# Altium footprint library Connector_PinHeader_2.00mm.PcbLib: 278 footprints (part 11 of 18)
Each footprint in its own frame and in the unit in brackets; x right, y up, seen from the top. Pads: shape width x height; smd on the part's side, far side on the other; paste and mask are expansions set on the pad; w line width, h text height; cw(c..) or ccw(c..) is an arc to the next point about the centre after c.
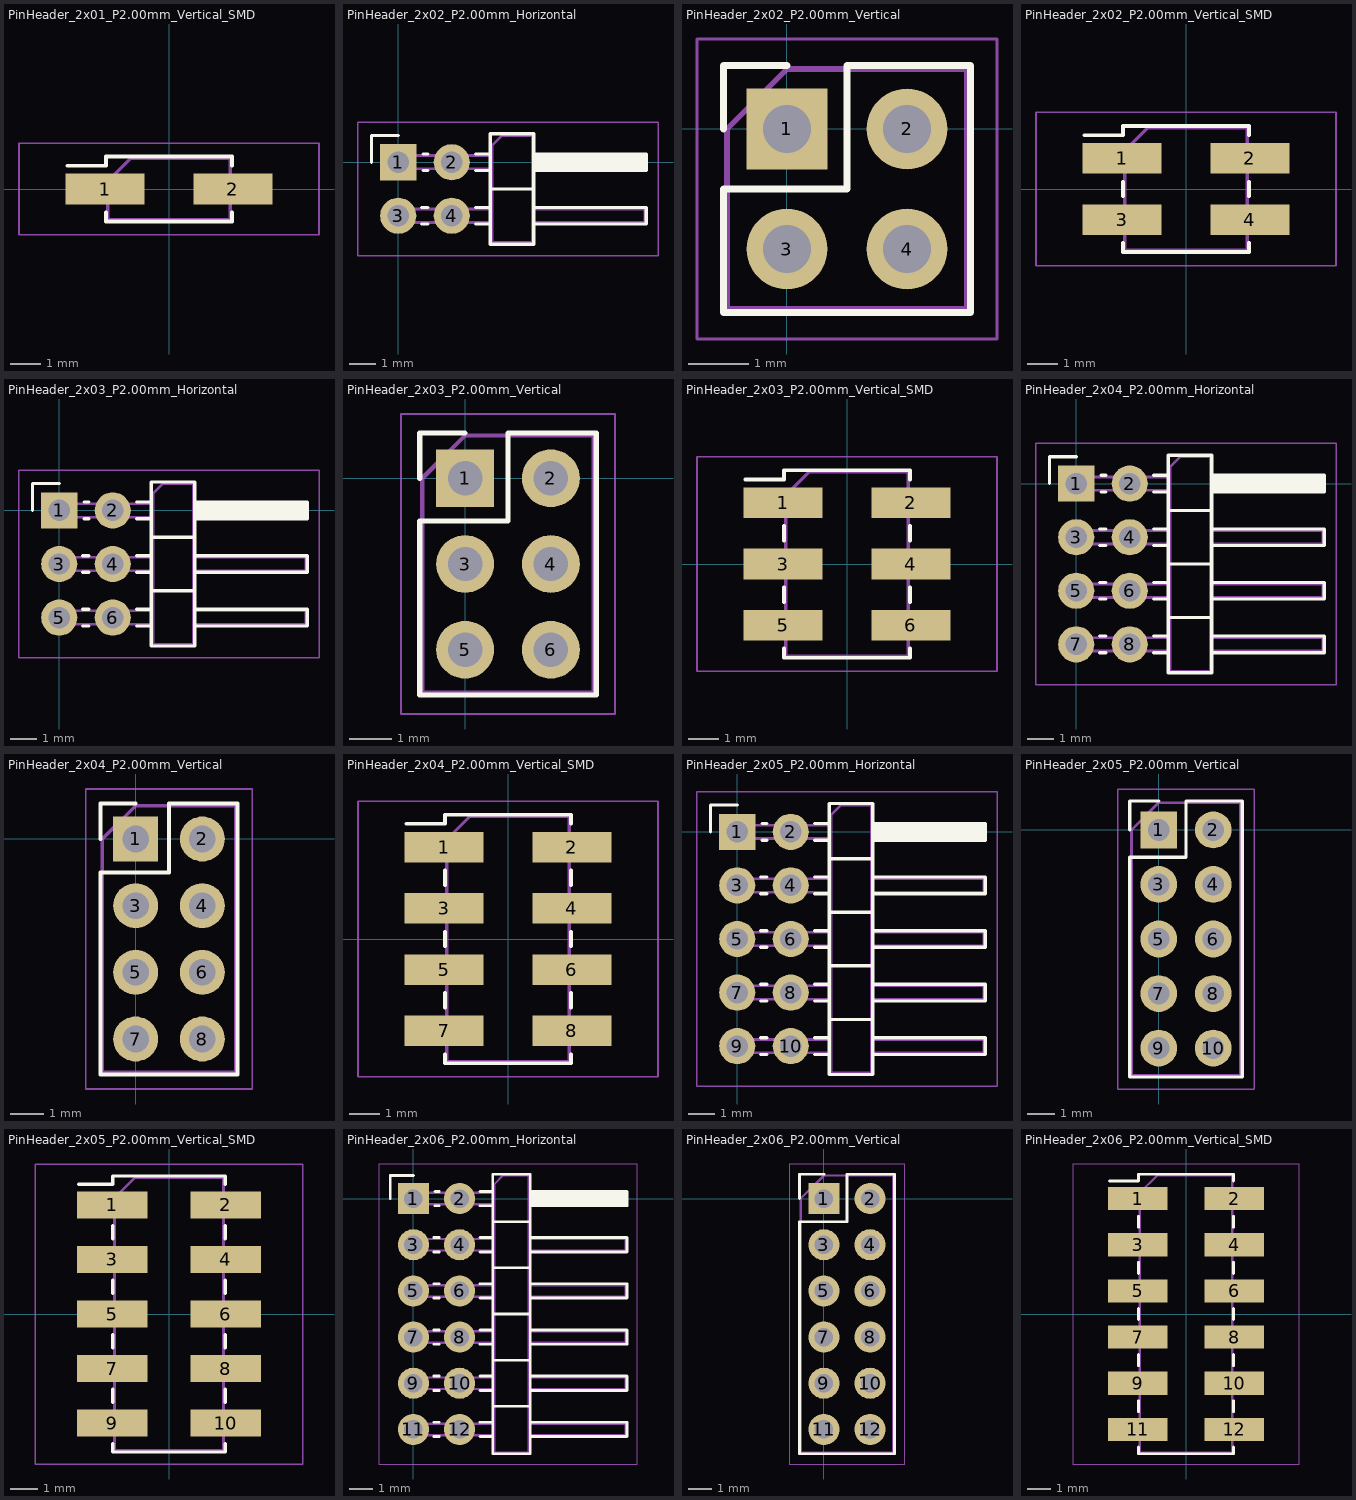
[diagram p10: the footprints below, top view; thin cyan lines are the x and y axes]

## PinHeader_2x01_P2.00mm_Vertical_SMD [mm]
pads (2):
  rect 2.58x1 smd: 1(-2.085,0) 2(2.085,0)
F.SilkS:
  lines w0.12: -3.315,0.76 -2.06,0.76 -2.06,1.06 2.06,1.06 2.06,0.76 ; -2.06,-0.76 -2.06,-1.06 2.06,-1.06 2.06,-0.76
F.CrtYd:
  lines w0.05: -4.9,-1.5 -4.9,1.5 4.9,1.5 4.9,-1.5 -4.9,-1.5
F.Fab:
  lines w0.1: -2,-0.25 -2.875,-0.25 -2.875,0.25 -2,0.25 ; 2,-0.25 2.875,-0.25 2.875,0.25 2,0.25 ; -2,0.25 -2,-1 2,-1 2,1 -1.25,1 -2,0.25
  text "'.Designator'" at 0.84,-4.047 h1

## PinHeader_2x02_P2.00mm_Horizontal [mm]
pads (4):
  rect 1.35x1.35 hole 0.8: 1(0,0)
  rrect100% 1.35x1.35 hole 0.8: 2(2,0) 3(0,-2) 4(2,-2)
F.SilkS:
  lines w0.12: -1,0 -1,1 0,1 ; 0.882,-2.31 1.118,-2.31 ; 0.882,-1.69 1.118,-1.69 ; 0.935,-0.31 1.118,-0.31 ; 0.935,0.31 1.118,0.31 ; 2.882,-2.31 3.44,-2.31 ; 2.882,-1.69 3.44,-1.69 ; 2.882,-0.31 3.44,-0.31 ; 2.882,0.31 3.44,0.31 ; 3.44,-1 5.06,-1 ; 5.06,-2.31 9.26,-2.31 9.26,-1.69 5.06,-1.69 ; 5.06,-0.31 9.26,-0.31 9.26,0.31 5.06,0.31 ; 5.06,-0.23 9.26,-0.23 ; 5.06,-0.11 9.26,-0.11 ; 5.06,0.01 9.26,0.01 ; 5.06,0.13 9.26,0.13 ; 5.06,0.25 9.26,0.25 ; 3.44,-3.06 3.44,1.06 5.06,1.06 5.06,-3.06 3.44,-3.06
F.CrtYd:
  lines w0.05: -1.5,-3.5 -1.5,1.5 9.7,1.5 9.7,-3.5 -1.5,-3.5
F.Fab:
  lines w0.1: 3.5,-2.25 -0.25,-2.25 -0.25,-1.75 3.5,-1.75 ; 3.5,-0.25 -0.25,-0.25 -0.25,0.25 3.5,0.25 ; 5,-2.25 9.2,-2.25 9.2,-1.75 5,-1.75 ; 5,-0.25 9.2,-0.25 9.2,0.25 5,0.25 ; 3.5,-3 3.5,0.625 3.875,1 5,1 5,-3 3.5,-3
  text "'.Designator'" at 5.006,-4.642 h0.9

## PinHeader_2x02_P2.00mm_Vertical [mm]
pads (4):
  rect 1.35x1.35 hole 0.8: 1(0,0)
  rrect100% 1.35x1.35 hole 0.8: 2(2,0) 3(0,-2) 4(2,-2)
F.SilkS:
  lines w0.12: -1.06,0 -1.06,1.06 0,1.06 ; -1.06,-3.06 3.06,-3.06 3.06,1.06 1,1.06 1,-1 -1.06,-1 -1.06,-3.06
F.CrtYd:
  lines w0.05: -1.5,-3.5 3.5,-3.5 3.5,1.5 -1.5,1.5 -1.5,-3.5
F.Fab:
  lines w0.1: -1,-3 3,-3 3,1 0,1 -1,0 -1,-3
  text "'.Designator'" at 1.84,-5.047 h1

## PinHeader_2x02_P2.00mm_Vertical_SMD [mm]
pads (4):
  rect 2.58x1 smd: 1(-2.085,1) 2(2.085,1) 3(-2.085,-1) 4(2.085,-1)
F.SilkS:
  lines w0.12: -3.315,1.76 -2.06,1.76 -2.06,2.06 2.06,2.06 2.06,1.76 ; -2.06,-1.76 -2.06,-2.06 2.06,-2.06 2.06,-1.76 ; -2.06,-0.24 -2.06,0.24 ; 2.06,-0.24 2.06,0.24
F.CrtYd:
  lines w0.05: -4.9,-2.5 -4.9,2.5 4.9,2.5 4.9,-2.5 -4.9,-2.5
F.Fab:
  lines w0.1: -2,-1.25 -2.875,-1.25 -2.875,-0.75 -2,-0.75 ; -2,0.75 -2.875,0.75 -2.875,1.25 -2,1.25 ; 2,-1.25 2.875,-1.25 2.875,-0.75 2,-0.75 ; 2,0.75 2.875,0.75 2.875,1.25 2,1.25 ; -2,1.25 -2,-2 2,-2 2,2 -1.25,2 -2,1.25
  text "'.Designator'" at 0.84,-4.047 h1

## PinHeader_2x03_P2.00mm_Horizontal [mm]
pads (6):
  rect 1.35x1.35 hole 0.8: 1(0,0)
  rrect100% 1.35x1.35 hole 0.8: 2(2,0) 3(0,-2) 4(2,-2) 5(0,-4) 6(2,-4)
F.SilkS:
  lines w0.12: -1,0 -1,1 0,1 ; 0.882,-4.31 1.118,-4.31 ; 0.882,-3.69 1.118,-3.69 ; 0.882,-2.31 1.118,-2.31 ; 0.882,-1.69 1.118,-1.69 ; 0.935,-0.31 1.118,-0.31 ; 0.935,0.31 1.118,0.31 ; 2.882,-4.31 3.44,-4.31 ; 2.882,-3.69 3.44,-3.69 ; 2.882,-2.31 3.44,-2.31 ; 2.882,-1.69 3.44,-1.69 ; 2.882,-0.31 3.44,-0.31 ; 2.882,0.31 3.44,0.31 ; 3.44,-3 5.06,-3 ; 3.44,-1 5.06,-1 ; 5.06,-4.31 9.26,-4.31 9.26,-3.69 5.06,-3.69 ; 5.06,-2.31 9.26,-2.31 9.26,-1.69 5.06,-1.69 ; 5.06,-0.31 9.26,-0.31 9.26,0.31 5.06,0.31 ; 5.06,-0.23 9.26,-0.23 ; 5.06,-0.11 9.26,-0.11 ; 5.06,0.01 9.26,0.01 ; 5.06,0.13 9.26,0.13 ; 5.06,0.25 9.26,0.25 ; 3.44,-5.06 5.06,-5.06 5.06,1.06 3.44,1.06 3.44,-5.06
F.CrtYd:
  lines w0.05: -1.5,-5.5 9.7,-5.5 9.7,1.5 -1.5,1.5 -1.5,-5.5
F.Fab:
  lines w0.1: 3.5,-4.25 -0.25,-4.25 -0.25,-3.75 3.5,-3.75 ; 3.5,-2.25 -0.25,-2.25 -0.25,-1.75 3.5,-1.75 ; 3.5,-0.25 -0.25,-0.25 -0.25,0.25 3.5,0.25 ; 5,-4.25 9.2,-4.25 9.2,-3.75 5,-3.75 ; 5,-2.25 9.2,-2.25 9.2,-1.75 5,-1.75 ; 5,-0.25 9.2,-0.25 9.2,0.25 5,0.25 ; 3.5,-5 3.5,0.625 3.875,1 5,1 5,-5 3.5,-5
  text "'.Designator'" at 5.006,-5.642 h0.9

## PinHeader_2x03_P2.00mm_Vertical [mm]
pads (6):
  rect 1.35x1.35 hole 0.8: 1(0,0)
  rrect100% 1.35x1.35 hole 0.8: 2(2,0) 3(0,-2) 4(2,-2) 5(0,-4) 6(2,-4)
F.SilkS:
  lines w0.12: -1.06,0 -1.06,1.06 0,1.06 ; -1.06,-5.06 -1.06,-1 1,-1 1,1.06 3.06,1.06 3.06,-5.06 -1.06,-5.06
F.CrtYd:
  lines w0.05: -1.5,-5.5 3.5,-5.5 3.5,1.5 -1.5,1.5 -1.5,-5.5
F.Fab:
  lines w0.1: -1,-5 3,-5 3,1 0,1 -1,0 -1,-5
  text "'.Designator'" at 1.84,-6.047 h1

## PinHeader_2x03_P2.00mm_Vertical_SMD [mm]
pads (6):
  rect 2.58x1 smd: 1(-2.085,2) 2(2.085,2) 3(-2.085,0) 4(2.085,0) 5(-2.085,-2) 6(2.085,-2)
F.SilkS:
  lines w0.12: -3.315,2.76 -2.06,2.76 -2.06,3.06 2.06,3.06 2.06,2.76 ; -2.06,-2.76 -2.06,-3.06 2.06,-3.06 2.06,-2.76 ; -2.06,-1.24 -2.06,-0.76 ; -2.06,0.76 -2.06,1.24 ; 2.06,-1.24 2.06,-0.76 ; 2.06,0.76 2.06,1.24
F.CrtYd:
  lines w0.05: -4.9,-3.5 4.9,-3.5 4.9,3.5 -4.9,3.5 -4.9,-3.5
F.Fab:
  lines w0.1: -2,-2.25 -2.875,-2.25 -2.875,-1.75 -2,-1.75 ; -2,-0.25 -2.875,-0.25 -2.875,0.25 -2,0.25 ; -2,1.75 -2.875,1.75 -2.875,2.25 -2,2.25 ; 2,-2.25 2.875,-2.25 2.875,-1.75 2,-1.75 ; 2,-0.25 2.875,-0.25 2.875,0.25 2,0.25 ; 2,1.75 2.875,1.75 2.875,2.25 2,2.25 ; -2,2.25 -1.25,3 2,3 2,-3 -2,-3 -2,2.25
  text "'.Designator'" at 0.84,-4.047 h1

## PinHeader_2x04_P2.00mm_Horizontal [mm]
pads (8):
  rect 1.35x1.35 hole 0.8: 1(0,0)
  rrect100% 1.35x1.35 hole 0.8: 2(2,0) 3(0,-2) 4(2,-2) 5(0,-4) 6(2,-4) 7(0,-6) 8(2,-6)
F.SilkS:
  lines w0.12: -1,0 -1,1 0,1 ; 0.882,-6.31 1.118,-6.31 ; 0.882,-5.69 1.118,-5.69 ; 0.882,-4.31 1.118,-4.31 ; 0.882,-3.69 1.118,-3.69 ; 0.882,-2.31 1.118,-2.31 ; 0.882,-1.69 1.118,-1.69 ; 0.935,-0.31 1.118,-0.31 ; 0.935,0.31 1.118,0.31 ; 2.882,-6.31 3.44,-6.31 ; 2.882,-5.69 3.44,-5.69 ; 2.882,-4.31 3.44,-4.31 ; 2.882,-3.69 3.44,-3.69 ; 2.882,-2.31 3.44,-2.31 ; 2.882,-1.69 3.44,-1.69 ; 2.882,-0.31 3.44,-0.31 ; 2.882,0.31 3.44,0.31 ; 3.44,-5 5.06,-5 ; 3.44,-3 5.06,-3 ; 3.44,-1 5.06,-1 ; 5.06,-6.31 9.26,-6.31 9.26,-5.69 5.06,-5.69 ; 5.06,-4.31 9.26,-4.31 9.26,-3.69 5.06,-3.69 ; 5.06,-2.31 9.26,-2.31 9.26,-1.69 5.06,-1.69 ; 5.06,-0.31 9.26,-0.31 9.26,0.31 5.06,0.31 ; 5.06,-0.23 9.26,-0.23 ; 5.06,-0.11 9.26,-0.11 ; 5.06,0.01 9.26,0.01 ; 5.06,0.13 9.26,0.13 ; 5.06,0.25 9.26,0.25 ; 3.44,-7.06 5.06,-7.06 5.06,1.06 3.44,1.06 3.44,-7.06
F.CrtYd:
  lines w0.05: -1.5,-7.5 -1.5,1.5 9.7,1.5 9.7,-7.5 -1.5,-7.5
F.Fab:
  lines w0.1: 3.5,-6.25 -0.25,-6.25 -0.25,-5.75 3.5,-5.75 ; 3.5,-4.25 -0.25,-4.25 -0.25,-3.75 3.5,-3.75 ; 3.5,-2.25 -0.25,-2.25 -0.25,-1.75 3.5,-1.75 ; 3.5,-0.25 -0.25,-0.25 -0.25,0.25 3.5,0.25 ; 5,-6.25 9.2,-6.25 9.2,-5.75 5,-5.75 ; 5,-4.25 9.2,-4.25 9.2,-3.75 5,-3.75 ; 5,-2.25 9.2,-2.25 9.2,-1.75 5,-1.75 ; 5,-0.25 9.2,-0.25 9.2,0.25 5,0.25 ; 3.5,-7 3.5,0.625 3.875,1 5,1 5,-7 3.5,-7
  text "'.Designator'" at 5.006,-6.642 h0.9

## PinHeader_2x04_P2.00mm_Vertical [mm]
pads (8):
  rect 1.35x1.35 hole 0.8: 1(0,0)
  rrect100% 1.35x1.35 hole 0.8: 2(2,0) 3(0,-2) 4(2,-2) 5(0,-4) 6(2,-4) 7(0,-6) 8(2,-6)
F.SilkS:
  lines w0.12: -1.06,0 -1.06,1.06 0,1.06 ; -1.06,-7.06 -1.06,-1 1,-1 1,1.06 3.06,1.06 3.06,-7.06 -1.06,-7.06
F.CrtYd:
  lines w0.05: -1.5,-7.5 3.5,-7.5 3.5,1.5 -1.5,1.5 -1.5,-7.5
F.Fab:
  lines w0.1: -1,-7 3,-7 3,1 0,1 -1,0 -1,-7
  text "'.Designator'" at 1.84,-7.047 h1

## PinHeader_2x04_P2.00mm_Vertical_SMD [mm]
pads (8):
  rect 2.58x1 smd: 1(-2.085,3) 2(2.085,3) 3(-2.085,1) 4(2.085,1) 5(-2.085,-1) 6(2.085,-1) 7(-2.085,-3) 8(2.085,-3)
F.SilkS:
  lines w0.12: -3.315,3.76 -2.06,3.76 -2.06,4.06 2.06,4.06 2.06,3.76 ; -2.06,-3.76 -2.06,-4.06 2.06,-4.06 2.06,-3.76 ; -2.06,-2.24 -2.06,-1.76 ; -2.06,-0.24 -2.06,0.24 ; -2.06,1.76 -2.06,2.24 ; 2.06,-2.24 2.06,-1.76 ; 2.06,-0.24 2.06,0.24 ; 2.06,1.76 2.06,2.24
F.CrtYd:
  lines w0.05: -4.9,-4.5 4.9,-4.5 4.9,4.5 -4.9,4.5 -4.9,-4.5
F.Fab:
  lines w0.1: -2,-3.25 -2.875,-3.25 -2.875,-2.75 -2,-2.75 ; -2,-1.25 -2.875,-1.25 -2.875,-0.75 -2,-0.75 ; -2,0.75 -2.875,0.75 -2.875,1.25 -2,1.25 ; -2,2.75 -2.875,2.75 -2.875,3.25 -2,3.25 ; 2,-3.25 2.875,-3.25 2.875,-2.75 2,-2.75 ; 2,-1.25 2.875,-1.25 2.875,-0.75 2,-0.75 ; 2,0.75 2.875,0.75 2.875,1.25 2,1.25 ; 2,2.75 2.875,2.75 2.875,3.25 2,3.25 ; -2,3.25 -2,-4 2,-4 2,4 -1.25,4 -2,3.25
  text "'.Designator'" at 0.84,-4.047 h1

## PinHeader_2x05_P2.00mm_Horizontal [mm]
pads (10):
  rect 1.35x1.35 hole 0.8: 1(0,0)
  rrect100% 1.35x1.35 hole 0.8: 2(2,0) 3(0,-2) 4(2,-2) 5(0,-4) 6(2,-4) 7(0,-6) 8(2,-6) 9(0,-8) 10(2,-8)
F.SilkS:
  lines w0.12: -1,0 -1,1 0,1 ; 0.882,-8.31 1.118,-8.31 ; 0.882,-7.69 1.118,-7.69 ; 0.882,-6.31 1.118,-6.31 ; 0.882,-5.69 1.118,-5.69 ; 0.882,-4.31 1.118,-4.31 ; 0.882,-3.69 1.118,-3.69 ; 0.882,-2.31 1.118,-2.31 ; 0.882,-1.69 1.118,-1.69 ; 0.935,-0.31 1.118,-0.31 ; 0.935,0.31 1.118,0.31 ; 2.882,-8.31 3.44,-8.31 ; 2.882,-7.69 3.44,-7.69 ; 2.882,-6.31 3.44,-6.31 ; 2.882,-5.69 3.44,-5.69 ; 2.882,-4.31 3.44,-4.31 ; 2.882,-3.69 3.44,-3.69 ; 2.882,-2.31 3.44,-2.31 ; 2.882,-1.69 3.44,-1.69 ; 2.882,-0.31 3.44,-0.31 ; 2.882,0.31 3.44,0.31 ; 3.44,-7 5.06,-7 ; 3.44,-5 5.06,-5 ; 3.44,-3 5.06,-3 ; 3.44,-1 5.06,-1 ; 5.06,-8.31 9.26,-8.31 9.26,-7.69 5.06,-7.69 ; 5.06,-6.31 9.26,-6.31 9.26,-5.69 5.06,-5.69 ; 5.06,-4.31 9.26,-4.31 9.26,-3.69 5.06,-3.69 ; 5.06,-2.31 9.26,-2.31 9.26,-1.69 5.06,-1.69 ; 5.06,-0.31 9.26,-0.31 9.26,0.31 5.06,0.31 ; 5.06,-0.23 9.26,-0.23 ; 5.06,-0.11 9.26,-0.11 ; 5.06,0.01 9.26,0.01 ; 5.06,0.13 9.26,0.13 ; 5.06,0.25 9.26,0.25 ; 3.44,-9.06 3.44,1.06 5.06,1.06 5.06,-9.06 3.44,-9.06
F.CrtYd:
  lines w0.05: -1.5,-9.5 -1.5,1.5 9.7,1.5 9.7,-9.5 -1.5,-9.5
F.Fab:
  lines w0.1: 3.5,-8.25 -0.25,-8.25 -0.25,-7.75 3.5,-7.75 ; 3.5,-6.25 -0.25,-6.25 -0.25,-5.75 3.5,-5.75 ; 3.5,-4.25 -0.25,-4.25 -0.25,-3.75 3.5,-3.75 ; 3.5,-2.25 -0.25,-2.25 -0.25,-1.75 3.5,-1.75 ; 3.5,-0.25 -0.25,-0.25 -0.25,0.25 3.5,0.25 ; 5,-8.25 9.2,-8.25 9.2,-7.75 5,-7.75 ; 5,-6.25 9.2,-6.25 9.2,-5.75 5,-5.75 ; 5,-4.25 9.2,-4.25 9.2,-3.75 5,-3.75 ; 5,-2.25 9.2,-2.25 9.2,-1.75 5,-1.75 ; 5,-0.25 9.2,-0.25 9.2,0.25 5,0.25 ; 3.5,-9 5,-9 5,1 3.875,1 3.5,0.625 3.5,-9
  text "'.Designator'" at 5.006,-7.642 h0.9

## PinHeader_2x05_P2.00mm_Vertical [mm]
pads (10):
  rect 1.35x1.35 hole 0.8: 1(0,0)
  rrect100% 1.35x1.35 hole 0.8: 2(2,0) 3(0,-2) 4(2,-2) 5(0,-4) 6(2,-4) 7(0,-6) 8(2,-6) 9(0,-8) 10(2,-8)
F.SilkS:
  lines w0.12: -1.06,0 -1.06,1.06 0,1.06 ; -1.06,-9.06 3.06,-9.06 3.06,1.06 1,1.06 1,-1 -1.06,-1 -1.06,-9.06
F.CrtYd:
  lines w0.05: -1.5,-9.5 3.5,-9.5 3.5,1.5 -1.5,1.5 -1.5,-9.5
F.Fab:
  lines w0.1: -1,-9 3,-9 3,1 0,1 -1,0 -1,-9
  text "'.Designator'" at 1.84,-8.047 h1

## PinHeader_2x05_P2.00mm_Vertical_SMD [mm]
pads (10):
  rect 2.58x1 smd: 1(-2.085,4) 2(2.085,4) 3(-2.085,2) 4(2.085,2) 5(-2.085,0) 6(2.085,0) 7(-2.085,-2) 8(2.085,-2) 9(-2.085,-4) 10(2.085,-4)
F.SilkS:
  lines w0.12: -3.315,4.76 -2.06,4.76 -2.06,5.06 2.06,5.06 2.06,4.76 ; -2.06,-4.76 -2.06,-5.06 2.06,-5.06 2.06,-4.76 ; -2.06,-3.24 -2.06,-2.76 ; -2.06,-1.24 -2.06,-0.76 ; -2.06,0.76 -2.06,1.24 ; -2.06,2.76 -2.06,3.24 ; 2.06,-3.24 2.06,-2.76 ; 2.06,-1.24 2.06,-0.76 ; 2.06,0.76 2.06,1.24 ; 2.06,2.76 2.06,3.24
F.CrtYd:
  lines w0.05: -4.9,-5.5 4.9,-5.5 4.9,5.5 -4.9,5.5 -4.9,-5.5
F.Fab:
  lines w0.1: -2,-4.25 -2.875,-4.25 -2.875,-3.75 -2,-3.75 ; -2,-2.25 -2.875,-2.25 -2.875,-1.75 -2,-1.75 ; -2,-0.25 -2.875,-0.25 -2.875,0.25 -2,0.25 ; -2,1.75 -2.875,1.75 -2.875,2.25 -2,2.25 ; -2,3.75 -2.875,3.75 -2.875,4.25 -2,4.25 ; 2,-4.25 2.875,-4.25 2.875,-3.75 2,-3.75 ; 2,-2.25 2.875,-2.25 2.875,-1.75 2,-1.75 ; 2,-0.25 2.875,-0.25 2.875,0.25 2,0.25 ; 2,1.75 2.875,1.75 2.875,2.25 2,2.25 ; 2,3.75 2.875,3.75 2.875,4.25 2,4.25 ; -2,4.25 -2,-5 2,-5 2,5 -1.25,5 -2,4.25
  text "'.Designator'" at 0.84,-4.047 h1

## PinHeader_2x06_P2.00mm_Horizontal [mm]
pads (12):
  rect 1.35x1.35 hole 0.8: 1(0,0)
  rrect100% 1.35x1.35 hole 0.8: 2(2,0) 3(0,-2) 4(2,-2) 5(0,-4) 6(2,-4) 7(0,-6) 8(2,-6) 9(0,-8) 10(2,-8) 11(0,-10) 12(2,-10)
F.SilkS:
  lines w0.12: -1,0 -1,1 0,1 ; 0.882,-10.31 1.118,-10.31 ; 0.882,-9.69 1.118,-9.69 ; 0.882,-8.31 1.118,-8.31 ; 0.882,-7.69 1.118,-7.69 ; 0.882,-6.31 1.118,-6.31 ; 0.882,-5.69 1.118,-5.69 ; 0.882,-4.31 1.118,-4.31 ; 0.882,-3.69 1.118,-3.69 ; 0.882,-2.31 1.118,-2.31 ; 0.882,-1.69 1.118,-1.69 ; 0.935,-0.31 1.118,-0.31 ; 0.935,0.31 1.118,0.31 ; 2.882,-10.31 3.44,-10.31 ; 2.882,-9.69 3.44,-9.69 ; 2.882,-8.31 3.44,-8.31 ; 2.882,-7.69 3.44,-7.69 ; 2.882,-6.31 3.44,-6.31 ; 2.882,-5.69 3.44,-5.69 ; 2.882,-4.31 3.44,-4.31 ; 2.882,-3.69 3.44,-3.69 ; 2.882,-2.31 3.44,-2.31 ; 2.882,-1.69 3.44,-1.69 ; 2.882,-0.31 3.44,-0.31 ; 2.882,0.31 3.44,0.31 ; 3.44,-9 5.06,-9 ; 3.44,-7 5.06,-7 ; 3.44,-5 5.06,-5 ; 3.44,-3 5.06,-3 ; 3.44,-1 5.06,-1 ; 5.06,-10.31 9.26,-10.31 9.26,-9.69 5.06,-9.69 ; 5.06,-8.31 9.26,-8.31 9.26,-7.69 5.06,-7.69 ; 5.06,-6.31 9.26,-6.31 9.26,-5.69 5.06,-5.69 ; 5.06,-4.31 9.26,-4.31 9.26,-3.69 5.06,-3.69 ; 5.06,-2.31 9.26,-2.31 9.26,-1.69 5.06,-1.69 ; 5.06,-0.31 9.26,-0.31 9.26,0.31 5.06,0.31 ; 5.06,-0.23 9.26,-0.23 ; 5.06,-0.11 9.26,-0.11 ; 5.06,0.01 9.26,0.01 ; 5.06,0.13 9.26,0.13 ; 5.06,0.25 9.26,0.25 ; 3.44,-11.06 3.44,1.06 5.06,1.06 5.06,-11.06 3.44,-11.06
F.CrtYd:
  lines w0.05: -1.5,-11.5 9.7,-11.5 9.7,1.5 -1.5,1.5 -1.5,-11.5
F.Fab:
  lines w0.1: 3.5,-10.25 -0.25,-10.25 -0.25,-9.75 3.5,-9.75 ; 3.5,-8.25 -0.25,-8.25 -0.25,-7.75 3.5,-7.75 ; 3.5,-6.25 -0.25,-6.25 -0.25,-5.75 3.5,-5.75 ; 3.5,-4.25 -0.25,-4.25 -0.25,-3.75 3.5,-3.75 ; 3.5,-2.25 -0.25,-2.25 -0.25,-1.75 3.5,-1.75 ; 3.5,-0.25 -0.25,-0.25 -0.25,0.25 3.5,0.25 ; 5,-10.25 9.2,-10.25 9.2,-9.75 5,-9.75 ; 5,-8.25 9.2,-8.25 9.2,-7.75 5,-7.75 ; 5,-6.25 9.2,-6.25 9.2,-5.75 5,-5.75 ; 5,-4.25 9.2,-4.25 9.2,-3.75 5,-3.75 ; 5,-2.25 9.2,-2.25 9.2,-1.75 5,-1.75 ; 5,-0.25 9.2,-0.25 9.2,0.25 5,0.25 ; 3.5,-11 3.5,0.625 3.875,1 5,1 5,-11 3.5,-11
  text "'.Designator'" at 5.006,-8.642 h0.9

## PinHeader_2x06_P2.00mm_Vertical [mm]
pads (12):
  rect 1.35x1.35 hole 0.8: 1(0,0)
  rrect100% 1.35x1.35 hole 0.8: 2(2,0) 3(0,-2) 4(2,-2) 5(0,-4) 6(2,-4) 7(0,-6) 8(2,-6) 9(0,-8) 10(2,-8) 11(0,-10) 12(2,-10)
F.SilkS:
  lines w0.12: -1.06,0 -1.06,1.06 0,1.06 ; -1.06,-11.06 -1.06,-1 1,-1 1,1.06 3.06,1.06 3.06,-11.06 -1.06,-11.06
F.CrtYd:
  lines w0.05: -1.5,-11.5 3.5,-11.5 3.5,1.5 -1.5,1.5 -1.5,-11.5
F.Fab:
  lines w0.1: -1,-11 -1,0 0,1 3,1 3,-11 -1,-11
  text "'.Designator'" at 1.84,-9.047 h1

## PinHeader_2x06_P2.00mm_Vertical_SMD [mm]
pads (12):
  rect 2.58x1 smd: 1(-2.085,5) 2(2.085,5) 3(-2.085,3) 4(2.085,3) 5(-2.085,1) 6(2.085,1) 7(-2.085,-1) 8(2.085,-1) 9(-2.085,-3) 10(2.085,-3) 11(-2.085,-5) 12(2.085,-5)
F.SilkS:
  lines w0.12: -3.315,5.76 -2.06,5.76 -2.06,6.06 2.06,6.06 2.06,5.76 ; -2.06,-5.76 -2.06,-6.06 2.06,-6.06 2.06,-5.76 ; -2.06,-4.24 -2.06,-3.76 ; -2.06,-2.24 -2.06,-1.76 ; -2.06,-0.24 -2.06,0.24 ; -2.06,1.76 -2.06,2.24 ; -2.06,3.76 -2.06,4.24 ; 2.06,-4.24 2.06,-3.76 ; 2.06,-2.24 2.06,-1.76 ; 2.06,-0.24 2.06,0.24 ; 2.06,1.76 2.06,2.24 ; 2.06,3.76 2.06,4.24
F.CrtYd:
  lines w0.05: -4.9,-6.5 -4.9,6.5 4.9,6.5 4.9,-6.5 -4.9,-6.5
F.Fab:
  lines w0.1: -2,-5.25 -2.875,-5.25 -2.875,-4.75 -2,-4.75 ; -2,-3.25 -2.875,-3.25 -2.875,-2.75 -2,-2.75 ; -2,-1.25 -2.875,-1.25 -2.875,-0.75 -2,-0.75 ; -2,0.75 -2.875,0.75 -2.875,1.25 -2,1.25 ; -2,2.75 -2.875,2.75 -2.875,3.25 -2,3.25 ; -2,4.75 -2.875,4.75 -2.875,5.25 -2,5.25 ; 2,-5.25 2.875,-5.25 2.875,-4.75 2,-4.75 ; 2,-3.25 2.875,-3.25 2.875,-2.75 2,-2.75 ; 2,-1.25 2.875,-1.25 2.875,-0.75 2,-0.75 ; 2,0.75 2.875,0.75 2.875,1.25 2,1.25 ; 2,2.75 2.875,2.75 2.875,3.25 2,3.25 ; 2,4.75 2.875,4.75 2.875,5.25 2,5.25 ; -2,5.25 -1.25,6 2,6 2,-6 -2,-6 -2,5.25
  text "'.Designator'" at 0.84,-4.047 h1